# Altium footprint library pcbSMDv1.PcbLib: 60 footprints (part 4 of 4)
Each footprint in its own frame and in the unit in brackets; x right, y up, seen from the top. Pads: shape width x height; smd on the part's side, far side on the other; paste and mask are expansions set on the pad; w line width, h text height; cw(c..) or ccw(c..) is an arc to the next point about the centre after c.
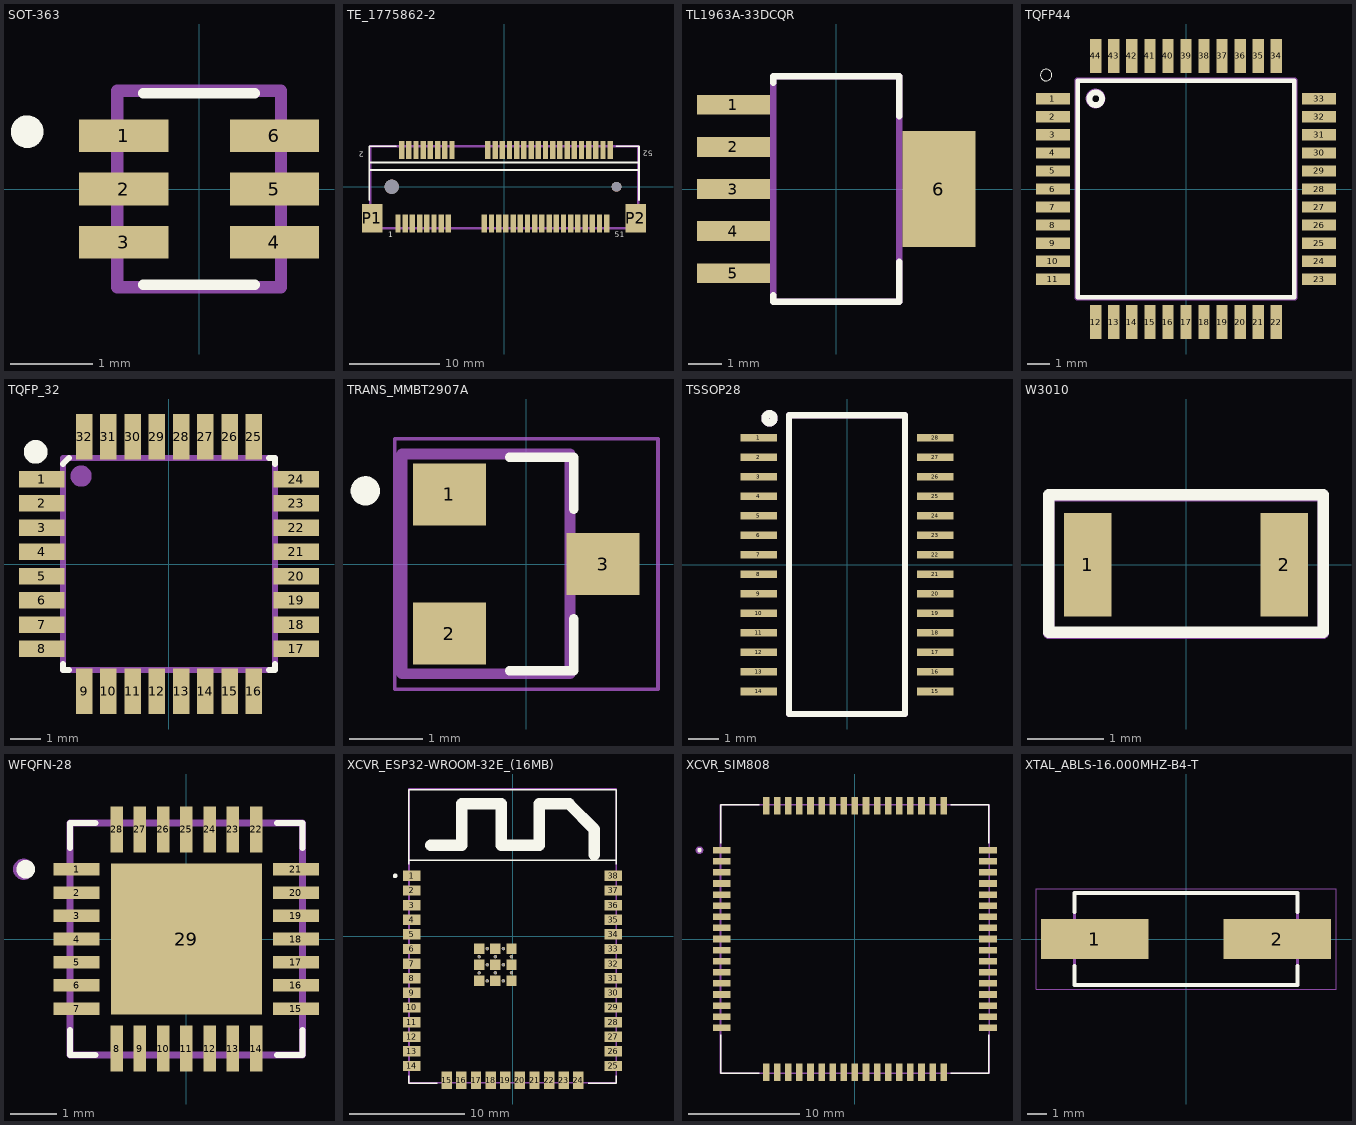
[diagram p3: the footprints below, top view; thin cyan lines are the x and y axes]

## SOT-363 [mm]
pads (6):
  rect 1.09x0.4 smd mask+0.05: 1(-0.92,0.65) 2(-0.92,0) 3(-0.92,-0.65) 4(0.92,-0.65) 5(0.92,0) 6(0.92,0.65)
Top Overlay:
  circle w0.2: c-2.1,0.7 r0.1
  lines w0.127: -0.68,-1.17 0.68,-1.17 ; -0.68,1.17 0.68,1.17
Mechanical 24:
  lines w0.15: -1,-1.2 1,-1.2 1,1.2 -1,1.2 -1,-1.2
  text ".Designator" at -1.446,-0.338 h1.52
3D body "User Library-SW3dPS-SOT363.step": height 1, standoff 0.01, extent -1.05,-1 1.05,1

## TE_1775862-2 [mm]
pads (56):
  rect 0.6x2 smd: 1(-11.8,-4.1) 2(-11.4,4.1) 3(-11,-4.1) 4(-10.6,4.1) 5(-10.2,-4.1) 6(-9.8,4.1) 7(-9.4,-4.1) 8(-9,4.1) 9(-8.6,-4.1) 10(-8.2,4.1) 11(-7.8,-4.1) 12(-7.4,4.1) 13(-7,-4.1) 14(-6.6,4.1) 15(-6.2,-4.1) 16(-5.8,4.1) 17(-2.2,-4.1) 18(-1.8,4.1) 19(-1.4,-4.1) 20(-1,4.1) 21(-0.6,-4.1) 22(-0.2,4.1) 23(0.2,-4.1) 24(0.6,4.1) 25(1,-4.1) 26(1.4,4.1) 27(1.8,-4.1) 28(2.2,4.1) 29(2.6,-4.1) 30(3,4.1) 31(3.4,-4.1) 32(3.8,4.1) 33(4.2,-4.1) 34(4.6,4.1) 35(5,-4.1) 36(5.4,4.1) 37(5.8,-4.1) 38(6.2,4.1) 39(6.6,-4.1) 40(7,4.1) 41(7.4,-4.1) 42(7.8,4.1) 43(8.2,-4.1) 44(8.6,4.1) 45(9,-4.1) 46(9.4,4.1) 47(9.8,-4.1) 48(10.2,4.1) 49(10.6,-4.1) 50(11,4.1) 51(11.4,-4.1) 52(11.8,4.1)
  rect 2.3x3.2 smd: P1(-14.65,-3.5) P2(14.65,-3.5)
  round 1.6 hole 1.6 unplated: ""(-12.5,0)
  round 1.1 hole 1.1 unplated: ""(12.5,0)
Top Overlay:
  lines w0.2: -15,-1.5 -15,4.5 -12,4.5 ; -15,1.86 15,1.86 ; -15,2.71 15,2.71 ; 12.5,4.5 15,4.5 15,-1.5
  text "1" at -12.9,-5.6 h0.61
  text "51" at 12.3,-5.6 h0.61
  text "52" at 16.5,4 h0.61
  text "2" at -15.6,3.9 h0.61
Mechanical 24:
  lines w0.254: -14.9,-4.6 14.9,-4.6 14.9,4.5 -14.9,4.5 -14.9,-4.6
  text ".Designator" at 0.154,0.862 h1.52
3D body "1775862-2.stp": height 5.15, standoff -0.7, extent -14.85,-4.58 15.05,4.5

## TL1963A-33DCQR [mm]
pads (6):
  rect 2.2x0.6 smd: 1(-3.1,2.54) 2(-3.1,1.27) 3(-3.1,0) 4(-3.1,-1.27) 5(-3.1,-2.54)
  rect 2.2x3.5 smd: 6(3.1,0)
Top Overlay:
  lines w0.2: -1.9,-3.2 -1.9,-3.4 1.9,-3.4 1.9,-2.2 ; -1.9,3.2 -1.9,3.4 1.9,3.4 1.9,2.2
Mechanical 24:
  lines w0.2: -1.9,-3.4 1.9,-3.4 1.9,3.4 -1.9,3.4 -1.9,-3.4
  text ".Designator" at -0.438,1.746 h1.52
3D body "User Library-TPS73701DCQ.STEP": height 1.71, standoff -0.09, extent -3.66,-3.275 3.6,3.275

## TQFP44 [mm]
pads (44):
  rect 1.5x0.5 smd: 1(-5.9,4) 2(-5.9,3.2) 3(-5.9,2.4) 4(-5.9,1.6) 5(-5.9,0.8) 6(-5.9,0) 7(-5.9,-0.8) 8(-5.9,-1.6) 9(-5.9,-2.4) 10(-5.9,-3.2) 11(-5.9,-4) 23(5.9,-4) 24(5.9,-3.2) 25(5.9,-2.4) 26(5.9,-1.6) 27(5.9,-0.8) 28(5.9,0) 29(5.9,0.8) 30(5.9,1.6) 31(5.9,2.4) 32(5.9,3.2) 33(5.9,4)
  rect 0.5x1.5 smd: 12(-4,-5.9) 13(-3.2,-5.9) 14(-2.4,-5.9) 15(-1.6,-5.9) 16(-0.8,-5.9) 17(0,-5.9) 18(0.8,-5.9) 19(1.6,-5.9) 20(2.4,-5.9) 21(3.2,-5.9) 22(4,-5.9) 34(4,5.9) 35(3.2,5.9) 36(2.4,5.9) 37(1.6,5.9) 38(0.8,5.9) 39(0,5.9) 40(-0.8,5.9) 41(-1.6,5.9) 42(-2.4,5.9) 43(-3.2,5.9) 44(-4,5.9)
Top Overlay:
  circle w0.254: c-4,4 r0.283
  circle w0: c-6.2,5.05 r0.254
  lines w0.203: -4.8,-4.8 4.8,-4.8 4.8,4.8 -4.8,4.8 -4.8,-4.8
Mechanical 24:
  circle w0.254: c-4.013,4.013 r0.309
  lines w0.254: -4.826,-4.826 4.826,-4.826 4.826,4.826 -4.826,4.826 -4.826,-4.826
  text ".Designator" at -1.194,-0.737 h1.52
3D body "atmega32u4-au.stp": height 1.1, standoff 0, extent -5.969,-5.969 6.031,6.031

## TQFP_32 [mm]
pads (32):
  rect 1.5x0.55 smd mask+0.06: 1(-4.2,2.8) 2(-4.2,2) 3(-4.2,1.2) 4(-4.2,0.4) 5(-4.2,-0.4) 6(-4.2,-1.2) 7(-4.2,-2) 8(-4.2,-2.8) 17(4.2,-2.8) 18(4.2,-2) 19(4.2,-1.2) 20(4.2,-0.4) 21(4.2,0.4) 22(4.2,1.2) 23(4.2,2) 24(4.2,2.8)
  rect 0.55x1.5 smd mask+0.06: 9(-2.8,-4.2) 10(-2,-4.2) 11(-1.2,-4.2) 12(-0.4,-4.2) 13(0.4,-4.2) 14(1.2,-4.2) 15(2,-4.2) 16(2.8,-4.2) 25(2.8,4.2) 26(2,4.2) 27(1.2,4.2) 28(0.4,4.2) 29(-0.4,4.2) 30(-1.2,4.2) 31(-2,4.2) 32(-2.8,4.2)
Top Overlay:
  circle w0.5: c-4.4,3.7 r0.141
  lines w0.2: -3.5,-3.3 -3.5,-3.5 -3.3,-3.5 ; -3.5,3.3 -3.3,3.5 ; 3.3,-3.5 3.5,-3.5 3.5,-3.3 ; 3.3,3.5 3.5,3.5 3.5,3.3 ; 3.5,-3.3 3.5,-3.4 3.5,-3.3
Mechanical 24:
  circle w0.5: c-2.9,2.9 r0.1
  lines w0.2: -3.5,-3.5 -3.5,3.5 3.5,3.5 3.5,-3.4 3.4,-3.5 -3.5,-3.5
  text ".Designator" at -1.146,-0.638 h1.52
3D body "User Library-tqfp32.step": height 1.2, standoff 0, extent -4.6,-4.599 4.599,4.599

## TRANS_MMBT2907A [mm]
pads (3):
  rect 1x0.85 smd: 1(-1.05,0.95) 2(-1.05,-0.95) 3(1.05,0)
Top Overlay:
  circle w0.2: c-2.2,1 r0.1
  lines w0.127: -0.23,-1.46 0.65,-1.46 0.65,-0.75 ; -0.23,1.46 0.65,1.46 0.65,0.75
Mechanical 15:
  lines w0.05: -1.8,-1.71 1.8,-1.71 1.8,1.71 -1.8,1.71 -1.8,-1.71
Mechanical 24:
  lines w0.15: -1.7,-1.5 0.6,-1.5 0.6,1.5 -1.7,1.5 -1.7,-1.5
  text ".Designator" at -0.946,-0.338 h1.52
3D body "2N7002H6327XTSA2.STEP": height 1.03, standoff 0.03, extent -1.25,-1.05 0.85,1.05

## TSSOP28 [mm]
pads (28):
  rect 1.2x0.25 smd: 1(-2.9,4.16) 2(-2.9,3.52) 3(-2.9,2.88) 4(-2.9,2.24) 5(-2.9,1.6) 6(-2.9,0.96) 7(-2.9,0.32) 8(-2.9,-0.32) 9(-2.9,-0.96) 10(-2.9,-1.6) 11(-2.9,-2.24) 12(-2.9,-2.88) 13(-2.9,-3.52) 14(-2.9,-4.16) 15(2.9,-4.16) 16(2.9,-3.52) 17(2.9,-2.88) 18(2.9,-2.24) 19(2.9,-1.6) 20(2.9,-0.96) 21(2.9,-0.32) 22(2.9,0.32) 23(2.9,0.96) 24(2.9,1.6) 25(2.9,2.24) 26(2.9,2.88) 27(2.9,3.52) 28(2.9,4.16)
Top Overlay:
  circle w0.254: c-2.541,4.8 r0.141
  lines w0.2: -1.9,-4.9 -1.9,4.9 1.9,4.9 1.9,-4.9 -1.9,-4.9
Mechanical 24:
  circle w0.254: c-2.541,4.8 r0.141
  lines w0.2: -1.9,-4.9 1.9,-4.9 1.9,4.9 -1.9,4.9 -1.9,-4.9
  text ".Designator" at -0.246,-0.738 h1.52
3D body "TSSOP-28.STEP": height 0.97, standoff -0.02, extent -3.15,-4.8 3.25,4.9

## W3010 [mm]
pads (2):
  rect 0.62x1.36 smd: 1(-1.29,0) 2(1.29,0)
Top Overlay:
  lines w0.15: -1.803,-0.889 1.803,-0.889 1.803,0.914 -1.803,0.914 -1.803,-0.889
Mechanical 24:
  lines w0.15: -1.8,-0.9 1.8,-0.9 1.8,0.9 -1.8,0.9 -1.8,-0.9
  text ".Designator" at -0.7,0.1 h1.2
3D body "w3043.STEP": height 1.6, standoff 0, extent -1.6,-0.55 1.6,0.55

## WFQFN-28 [mm]
pads (29):
  rect 0.99x0.27 smd mask+0.05: 1(-2.36,1.5) 2(-2.36,1) 3(-2.36,0.5) 4(-2.36,0) 5(-2.36,-0.5) 6(-2.36,-1) 7(-2.36,-1.5) 15(2.36,-1.5) 16(2.36,-1) 17(2.36,-0.5) 18(2.36,0) 19(2.36,0.5) 20(2.36,1) 21(2.36,1.5)
  rect 0.27x0.99 smd mask+0.05: 8(-1.5,-2.36) 9(-1,-2.36) 10(-0.5,-2.36) 11(0,-2.36) 12(0.5,-2.36) 13(1,-2.36) 14(1.5,-2.36) 22(1.5,2.36) 23(1,2.36) 24(0.5,2.36) 25(0,2.36) 26(-0.5,2.36) 27(-1,2.36) 28(-1.5,2.36)
  rect 3.25x3.25 smd paste-0.597 mask+0.05: 29(0,0)
Top Overlay:
  circle w0.2: c-3.455,1.5 r0.1
  lines w0.127: -2.5,-1.955 -2.5,-2.5 -1.955,-2.5 ; -2.5,1.955 -2.5,2.5 -1.955,2.5 ; 1.955,-2.5 2.5,-2.5 2.5,-1.955 ; 1.955,2.5 2.5,2.5 2.5,1.955
Mechanical 24:
  circle w0.254: c-3.5,1.5 r0.1
  lines w0.15: -2.5,-2.5 2.5,-2.5 2.5,2.5 -2.5,2.5 -2.5,-2.5
  text ".Designator" at -0.746,-0.838 h1.52
3D body "cp2102n-a01-gqfn28.stp": height 0.75, standoff 0, extent -2.51,-2.51 2.51,2.51

## XCVR_ESP32-WROOM-32E_(16MB) [mm]
pads (59):
  rect 1.5x0.9 smd: 1(-8.75,5.26) 2(-8.75,3.99) 3(-8.75,2.72) 4(-8.75,1.45) 5(-8.75,0.18) 6(-8.75,-1.09) 7(-8.75,-2.36) 8(-8.75,-3.63) 9(-8.75,-4.9) 10(-8.75,-6.17) 11(-8.75,-7.44) 12(-8.75,-8.71) 13(-8.75,-9.98) 14(-8.75,-11.25) 25(8.75,-11.25) 26(8.75,-9.98) 27(8.75,-8.71) 28(8.75,-7.44) 29(8.75,-6.17) 30(8.75,-4.9) 31(8.75,-3.63) 32(8.75,-2.36) 33(8.75,-1.09) 34(8.75,0.18) 35(8.75,1.45) 36(8.75,2.72) 37(8.75,3.99) 38(8.75,5.26)
  rect 0.9x1.5 smd: 15(-5.715,-12.5) 16(-4.445,-12.5) 17(-3.175,-12.5) 18(-1.905,-12.5) 19(-0.635,-12.5) 20(0.635,-12.5) 21(1.905,-12.5) 22(3.175,-12.5) 23(4.445,-12.5) 24(5.715,-12.5)
  rect 0.9x0.9 smd: 39_1(-2.9,-1.06) 39_2(-1.5,-1.06) 39_3(-0.1,-1.06) 39_4(-2.9,-2.46) 39_5(-1.5,-2.46) 39_6(-0.1,-2.46) 39_7(-2.9,-3.86) 39_8(-1.5,-3.86) 39_9(-0.1,-3.86)
  round 0.3 hole 0.2 mask+0: 39_10(-2.2,-1.06) 39_11(-0.8,-1.06) 39_12(-2.9,-1.76) 39_13(-1.5,-1.76) 39_14(-0.1,-1.76) 39_15(-2.2,-2.46) 39_16(-0.8,-2.46) 39_17(-2.9,-3.16) 39_18(-1.5,-3.16) 39_19(-0.1,-3.16) 39_20(-2.2,-3.86) 39_21(-0.8,-3.86)
Top Overlay:
  circle w0.2: c-10.2,5.26 r0.1
  lines w0.127: -9,-12.1 -9,-12.75 -6.55,-12.75 ; -9,6.25 -9,12.75 9,12.75 9,6.25 ; -9,6.6 9,6.6 ; 6.55,-12.75 9,-12.75 9,-12.1
  lines w1: -7.1,7.9 -4.4,7.9 -4.4,11.5 -1,11.5 -1,7.9 2.3,7.9 2.3,11.5 4.9,11.5 7.1,9.3 7.1,7.1
Mechanical 24:
  lines w0.15: -9,-12.7 -9,12.8 9,12.8 9,-12.7 -9,-12.7
  text ".Designator" at -2.946,2.962 h1.52
3D body "ESP32-WROOM-32E (16MB)--3DModel-STEP-269445.STEP": height 3.25, standoff 0, extent -9,-12.75 9,12.75

## XCVR_SIM808 [mm]
pads (68):
  rect 1.6x0.6 smd: 1(-12,8) 2(-12,7) 3(-12,6) 4(-12,5) 5(-12,4) 6(-12,3) 7(-12,2) 8(-12,1) 9(-12,0) 10(-12,-1) 11(-12,-2) 12(-12,-3) 13(-12,-4) 14(-12,-5) 15(-12,-6) 16(-12,-7) 17(-12,-8) 35(12,-8) 36(12,-7) 37(12,-6) 38(12,-5) 39(12,-4) 40(12,-3) 41(12,-2) 42(12,-1) 43(12,0) 44(12,1) 45(12,2) 46(12,3) 47(12,4) 48(12,5) 49(12,6) 50(12,7) 51(12,8)
  rect 0.6x1.6 smd: 18(-8,-12) 19(-7,-12) 20(-6,-12) 21(-5,-12) 22(-4,-12) 23(-3,-12) 24(-2,-12) 25(-1,-12) 26(0,-12) 27(1,-12) 28(2,-12) 29(3,-12) 30(4,-12) 31(5,-12) 32(6,-12) 33(7,-12) 34(8,-12) 52(8,12) 53(7,12) 54(6,12) 55(5,12) 56(4,12) 57(3,12) 58(2,12) 59(1,12) 60(0,12) 61(-1,12) 62(-2,12) 63(-3,12) 64(-4,12) 65(-5,12) 66(-6,12) 67(-7,12) 68(-8,12)
Top Overlay:
  circle w0.2: c-14,8 r0.1
  lines w0.127: -12.075,-8.62 -12.075,-12.075 -8.62,-12.075 ; -12.075,8.62 -12.075,12.075 -8.62,12.075 ; 8.62,-12.075 12.075,-12.075 12.075,-8.62 ; 8.62,12.075 12.075,12.075 12.075,8.62
Mechanical 24:
  circle w0.254: c-14,8 r0.224
  lines w0.15: -12.1,-12.1 12.1,-12.1 12.1,12.1 -12.1,12.1 -12.1,-12.1
  text ".Designator" at 0.254,0.662 h1.52
3D body "SIM808--3DModel-STEP-56544.STEP": height 2.8, standoff 0, extent -12,-12 12,12

## XTAL_ABLS-16.000MHZ-B4-T [mm]
height 4.2
pads (2):
  rect 5.6x2.1 smd: 1(-4.75,0) 2(4.75,0)
Top Overlay:
  lines w0.2: -5.8,-1.4 -5.8,-2.4 5.8,-2.4 5.8,-1.4 ; -5.8,1.4 -5.8,2.4 5.8,2.4 5.8,1.4
Mechanical 15:
  lines w0.05: -7.8,-2.6 -7.8,2.6 7.8,2.6 7.8,-2.6 -7.8,-2.6
Mechanical 24:
  lines w0.15: -5.8,-2.4 5.8,-2.4 5.8,2.4 -5.8,2.4 -5.8,-2.4
  text ".Designator" at 0.154,0.462 h1.52
3D body "step_temp.STEP": height 4.06, standoff -0.1, extent -6.35,-2.349 6.35,2.349